# Altium footprint library BeaconBoard.PcbLib: 39 footprints (part 1 of 3) (continued)
## CP_32_7_ADI-M [mm] (continued)
  text "*" at -2.405,1.585 h0.64
Mechanical 15:
  region: -2.395,-3.058 -3.058,-3.058 -3.058,-2.395 -3.458,-2.395 -3.458,2.395 -3.058,2.395 -3.058,3.058 -2.395,3.058 -2.395,3.458 2.395,3.458 2.395,3.058 3.058,3.058 3.058,2.395 3.458,2.395 3.458,-2.395 3.058,-2.395 3.058,-3.058 2.395,-3.058 2.395,-3.458 -2.395,-3.458
  lines w0.152: -3.458,-2.395 -3.458,2.395 -3.058,2.395 -3.058,3.058 -2.395,3.058 -2.395,3.458 2.395,3.458 2.395,3.058 3.058,3.058 3.058,2.395 3.458,2.395 3.458,-2.395 3.058,-2.395 3.058,-3.058 2.395,-3.058 2.395,-3.458 -2.395,-3.458 -2.395,-3.058 -3.058,-3.058 -3.058,-2.395 -3.458,-2.395
3D body: height 0.25, standoff 0, extent 0,0 0.254,0.254
3D body "CP_32_7_ADI.step": height 0.8, standoff 0, extent -2.55,-2.55 2.55,2.55

## DBV0005A-IPC_A [mm]
pads (5):
  rect 1.805x0.612 smd paste+0 mask+0: 1(-1.15,0.95) 2(-1.15,0) 3(-1.15,-0.95) 4(1.15,-0.95) 5(1.15,0.95)
Top Overlay:
  circle w0.25: c-2.903,0.975 r0.125
  lines w0.15: -1.4,-1.7 1.4,-1.7 ; -1.4,1.7 1.4,1.7
Mechanical 13:
  lines w0.15: -0.8,-1.45 -0.8,1.45 0.8,1.45 0.8,-1.45 -0.8,-1.45
3D body: height 0.25, standoff 0, extent 0,0 0.254,0.254
3D body "DBV0005A.stp": height 1.2, standoff 0, extent -1.4,-1.45 1.4,1.45

## DBV0005A-IPC_B [mm]
pads (5):
  rect 1.505x0.572 smd paste+0 mask+0: 1(-1.1,0.95) 2(-1.1,0) 3(-1.1,-0.95) 4(1.1,-0.95) 5(1.1,0.95)
Top Overlay:
  circle w0.25: c-2.528,0.975 r0.125
  lines w0.15: -1.4,-1.7 1.4,-1.7 ; -1.4,1.7 1.4,1.7
Mechanical 13:
  lines w0.15: -0.8,-1.45 -0.8,1.45 0.8,1.45 0.8,-1.45 -0.8,-1.45
3D body "DBV0005A.stp": height 1.2, standoff 0, extent -1.4,-1.45 1.4,1.45
3D body: height 0.25, standoff 0, extent 0,0 0.254,0.254

## DBV0005A-IPC_C [mm]
pads (5):
  rect 1.205x0.532 smd paste+0 mask+0: 1(-1.05,0.95) 2(-1.05,0) 3(-1.05,-0.95) 4(1.05,-0.95) 5(1.05,0.95)
Top Overlay:
  circle w0.25: c-2.328,0.975 r0.125
  lines w0.15: -0.052,-1.45 0.052,-1.45 0.052,1.45 -0.052,1.45 -0.052,-1.45
Mechanical 13:
  lines w0.15: -0.8,-1.45 -0.8,1.45 0.8,1.45 0.8,-1.45 -0.8,-1.45
3D body: height 0.25, standoff 0, extent 0,0 0.254,0.254
3D body "DBV0005A.stp": height 1.2, standoff 0, extent -1.4,-1.45 1.4,1.45

## DBV0005A-MFG [mm]
pads (5):
  rect 1.1x0.6 smd paste+0 mask+0: 1(-1.3,0.95) 2(-1.3,0) 3(-1.3,-0.95) 4(1.3,-0.95) 5(1.3,0.95)
Top Overlay:
  circle w0.25: c-2.45,0.95 r0.125
  lines w0.15: -0.375,-1.525 0.375,-1.525 ; -0.375,1.525 0.375,1.525 ; 0.875,-0.275 0.875,0.275
Mechanical 13:
  lines w0.15: -0.875,-1.525 -0.875,1.525 0.875,1.525 0.875,-1.525 -0.875,-1.525
3D body: height 0.25, standoff 0, extent 0,0 0.254,0.254
3D body "DBV0005A.stp": height 1.2, standoff 0, extent -1.4,-1.45 1.4,1.45

## DPAK254P1510X470-3N [mm] "D2-PAK, 3-Pads, Body 7.73x8.49mm (max), IPC Medium Density"
height 4.7
pads (3):
  rect 3.7x1 smd: 1(-6.65,2.54) 3(-6.65,-2.54)
  rect 8.6x10.35 smd: 2(4.25,0)
Top Overlay:
  circle w0.25: c-6.65,3.59 r0.125
  lines w0.2: -0.45,-5.15 -2.45,-5.15 -2.45,5.15 -0.45,5.15
Mechanical 13:
  lines w0.1: -2.45,-5.125 6.8,-5.125 6.8,5.125 -2.45,5.125 -2.45,-5.125
Mechanical 15:
  lines w0.05: -8.75,-5.425 8.75,-5.425 8.75,5.425 -8.75,5.425 -8.75,-5.425
  lines w0.1: -0.5,0 0.5,0 ; 0,-0.5 0,0.5
3D body "DPAK254P1510X470-3N.step": height 4.7, standoff 0, extent -6.715,-5.125 8.385,5.125

## EM33X [mm] "Butterfly for GH High Power DFB Laser"
pads (14):
  round 1.7 hole 1.2: 1(7.62,9) 2(5.08,9) 3(2.54,9) 4(0,9) 5(-2.54,9) 6(-5.08,9) 7(-7.62,9) 8(-7.62,-9) 9(-5.08,-9) 10(-2.54,-9) 11(0,-9) 12(2.54,-9) 13(5.08,-9) 14(7.62,-9)
Keep-Out Layer:
  board cut-out: -16,6.5 -16,6.598 -15.962,6.792 -15.886,6.974 -15.777,7.137 -15.637,7.277 -15.474,7.386 -15.292,7.462 -15.098,7.5 -15,7.5 15,7.5 15.098,7.5 15.292,7.462 15.474,7.386 15.637,7.277 15.777,7.137 15.886,6.974 15.962,6.792 16,6.598 16,6.5 16,-6.5 16,-6.598 15.962,-6.792 15.886,-6.974 15.777,-7.137 15.637,-7.277 15.474,-7.386 15.292,-7.462 15.098,-7.5 15,-7.5 -15,-7.5 -15.098,-7.5 -15.292,-7.462 -15.474,-7.386 -15.637,-7.277 -15.777,-7.137 -15.886,-6.974 -15.962,-6.792 -16,-6.598 -16,-6.5
Mechanical 5:
  circle w0.254: c13.02,-4.445 r1.35
  circle w0.254: c-13.02,-4.445 r1.35
  circle w0.254: c-13.02,4.445 r1.35
  circle w0.254: c13.02,4.445 r1.35
  lines w0.254: -10.415,-6.35 -10.415,6.35 ; -9.15,-6.35 -9.15,-6.85 9.15,-6.85 9.15,-6.35 ; -9.15,6.35 -9.15,6.85 9.15,6.85 9.15,6.35 ; 10.415,-6.35 10.415,6.35 ; -14.99,-6.35 -14.99,6.35 14.99,6.35 14.99,-6.35 -14.99,-6.35
Multi-Layer:
  pour cut-out: -16.5,6.5 -16.5,6.648 -16.442,6.938 -16.329,7.211 -16.165,7.456 -15.956,7.665 -15.711,7.829 -15.438,7.942 -15.148,8 -15,8 15,8 15.148,8 15.438,7.942 15.711,7.829 15.956,7.665 16.165,7.456 16.329,7.211 16.442,6.938 16.5,6.648 16.5,6.5 16.5,-6.5 16.5,-6.648 16.442,-6.938 16.329,-7.211 16.165,-7.456 15.956,-7.665 15.711,-7.829 15.438,-7.942 15.148,-8 15,-8 -15,-8 -15.148,-8 -15.438,-7.942 -15.711,-7.829 -15.956,-7.665 -16.165,-7.456 -16.329,-7.211 -16.442,-6.938 -16.5,-6.648 -16.5,-6.5
3D body: height 5.15, standoff 3.55, extent -0.8,6.85 0.794,6.95
3D body: height 5.75, standoff 2.95, extent -9.15,-6.85 9.15,-6.35
3D body: height 5.75, standoff 2.95, extent -9.15,6.35 9.15,6.85
3D body: height 7.15, standoff 0.35, extent -10.415,-6.35 10.415,6.35
3D body: height 0.35, standoff -0.65, extent -14.99,-6.35 14.99,6.35
3D body: height 5.15, standoff 3.55, extent 1.74,6.85 3.334,6.95
3D body: height 5.15, standoff 3.55, extent 4.28,6.85 5.874,6.95
3D body: height 5.15, standoff 3.55, extent 6.82,6.85 8.414,6.95
3D body: height 5.15, standoff 3.55, extent -8.413,6.85 -6.82,6.95
3D body: height 5.15, standoff 3.55, extent -5.873,6.85 -4.28,6.95
3D body: height 5.15, standoff 3.55, extent -3.333,6.85 -1.74,6.95
3D body: height 5.15, standoff 3.55, extent 1.739,-6.95 3.333,-6.85
3D body: height 5.15, standoff 3.55, extent 4.279,-6.95 5.873,-6.85
3D body: height 5.15, standoff 3.55, extent 6.819,-6.95 8.413,-6.85
3D body: height 5.15, standoff 3.55, extent -8.414,-6.95 -6.82,-6.85
3D body: height 5.15, standoff 3.55, extent -5.874,-6.95 -4.28,-6.85
3D body: height 5.15, standoff 3.55, extent -3.334,-6.95 -1.74,-6.85
3D body: height 5.15, standoff 3.55, extent -0.794,-6.95 0.8,-6.85
3D body: height 6.45, standoff 2.05, extent 10.415,-2.197 30.415,2.197
3D body: height 4.7, standoff 3.8, extent 28.909,-0.449 31.909,0.449

## GH High Power DFB Laser AA1401 [mm] "Laser Pulser"
pads (14):
  rect 0.7x2.5 smd: 1(7.62,9.675) 2(5.08,9.675) 3(2.54,9.675) 4(0,9.675) 5(-2.54,9.675) 6(-5.08,9.675) 7(-7.62,9.675) 8(-7.62,-9.675) 9(-5.08,-9.675) 10(-2.54,-9.675) 11(0,-9.675) 13(5.08,-9.675) 14(7.62,-9.675)
  rect 0.5x2.5 smd: 12(2.54,-9.675)
Top Overlay:
  lines w0.254: -10.75,-7.5 -10.25,-8 10.25,-8 10.75,-7.5 10.75,-5 10.75,-3 11.125,-2.625 11.25,-2.5 36.75,-2.5 37.25,-2 37.25,1.875 37.25,2 36.75,2.5 11.25,2.5 10.75,3 10.75,7.5 10.25,8 -10.25,8 -10.75,7.5 -10.75,-7.5
Keep-Out Layer:
  board cut-out: 10.25,7.875 10.625,7.5 10.625,3 11.25,2.375 36.75,2.375 37.125,2 37.125,-2 36.75,-2.375 11.25,-2.375 10.625,-3 10.625,-7.5 10.25,-7.875 -10.25,-7.875 -10.625,-7.5 -10.625,7.5 -10.25,7.875
Multi-Layer:
  pour cut-out: -10.375,8.125 -10.75,7.75 -10.875,7.625 -10.875,-7.625 -10.375,-8.125 10.375,-8.125 10.875,-7.625 10.875,-3.125 11.375,-2.625 23.125,-2.625 36.875,-2.625 37.375,-2.125 37.375,2.125 36.875,2.625 11.375,2.625 10.875,3.125 10.875,7.625 10.375,8.125
3D body "AA1401_series_laser_trimmed.STEP": height 4.04, standoff -5.45, extent -14.975,-11.525 37.225,11.575

## IC24_TPS259802ONRGER_TEX [mil]
pads (26):
  rect 31x8 smd paste+0 mask+0: 1(-77,49.21) 2(-77,29.53) 3(-77,9.84) 4(-77,-9.84) 5(-77,-29.53) 6(-77,-49.21) 13(77,-49.21) 14(77,-29.53) 15(77,-9.84) 16(77,9.84) 17(77,29.53) 18(77,49.21)
  rect 8x31 smd paste+0 mask+0: 7(-49.21,-77) 8(-29.53,-77) 9(-9.84,-77) 10(9.84,-77) 11(29.53,-77) 12(49.21,-77) 19(49.21,77) 20(29.53,77) 21(9.84,77) 22(-9.84,77) 23(-29.53,77) 24(-49.21,77)
  rect 106x61 smd paste+0 mask+0: 25(0,24.61)
  rect 106x37 smd paste+0 mask+0: 26(0,-37.4)
Top Overlay:
  region: 37.03,102.5 22.03,102.5 22.03,112.5 37.03,112.5
  region: 17.34,-102.5 2.34,-102.5 2.34,-112.5 17.34,-112.5
  lines w6: -85.5,-66.31 -85.5,-85.5 -66.31,-85.5 ; -85.5,66.31 -85.5,85.5 -66.31,85.5 ; 66.31,-85.5 85.5,-85.5 85.5,-66.31 ; 66.31,85.5 85.5,85.5 85.5,66.31
  text "*" at -130,24.21 h50
Mechanical 5:
  region: 117.5,-117.5 -117.5,-117.5 -117.5,117.5 117.5,117.5
Mechanical 7:
  lines w1: -276.5,-80.5 80.5,-80.5 ; -276.5,80.5 80.5,80.5 80.5,-226.5 ; -195.5,-5.89 -53,-5.89 -53,-145.5 ; -195.5,55.11 -53,55.11 ; -180.5,-55.89 -180.5,-5.89 ; -180.5,105.11 -180.5,55.11 ; -103,-130.5 -53,-130.5 ; -103,130.5 -53,130.5 ; -80.5,-226.5 -80.5,80.5 ; -80.5,49.21 -80.5,276.5 ; -53,55.9 -53,145.5 ; 11.5,186.5 61.5,186.5 ; 49.21,80.5 276.5,80.5 ; 53,-145.5 53,-5.89 ; 53,55.11 53,145.5 ; 61.5,49.21 61.5,201.5 ; 77,29.53 201.5,29.53 ; 77,49.21 201.5,49.21 ; 80.5,-49.21 195.5,-49.21 ; 80.5,201.5 80.5,49.21 80.5,276.5 ; 103,-130.5 53,-130.5 ; 103,130.5 53,130.5 ; 130.5,186.5 80.5,186.5 ; 180.5,-130.5 180.5,-80.5 ; 180.5,0.79 180.5,-49.21 ; 186.5,-20.47 186.5,29.53 ; 186.5,99.21 186.5,49.21 ; 195.5,-80.5 49.21,-80.5 276.5,-80.5 ; -261.5,-80.5 -256.5,-70.5 -266.5,-70.5 -261.5,-80.5 ; -261.5,-80.5 -261.5,80.5 ; -261.5,80.5 -256.5,70.5 -266.5,70.5 -261.5,80.5 ; -180.5,-5.89 -175.5,-15.89 -185.5,-15.89 -180.5,-5.89 ; -180.5,55.11 -175.5,65.11 -185.5,65.11 -180.5,55.11 ; -80.5,-211.5 -70.5,-216.5 -70.5,-206.5 -80.5,-211.5 ; -80.5,-211.5 80.5,-211.5 ; -80.5,261.5 -70.5,256.5 -70.5,266.5 -80.5,261.5 ; -80.5,261.5 80.5,261.5 ; -53,-130.5 -63,-135.5 -63,-125.5 -53,-130.5 ; -53,130.5 -63,125.5 -63,135.5 -53,130.5 ; 53,-130.5 63,-135.5 63,-125.5 53,-130.5 ; 53,130.5 63,125.5 63,135.5 53,130.5 ; 61.5,186.5 51.5,181.5 51.5,191.5 61.5,186.5 ; 80.5,-211.5 70.5,-216.5 70.5,-206.5 80.5,-211.5 ; 80.5,186.5 90.5,181.5 90.5,191.5 80.5,186.5 ; 80.5,261.5 70.5,256.5 70.5,266.5 80.5,261.5 ; 180.5,-80.5 185.5,-90.5 175.5,-90.5 180.5,-80.5 ; 180.5,-49.21 185.5,-39.21 175.5,-39.21 180.5,-49.21 ; 186.5,29.53 191.5,19.53 181.5,19.53 186.5,29.53 ; 186.5,49.21 191.5,59.21 181.5,59.21 186.5,49.21 ; 261.5,-80.5 266.5,-70.5 256.5,-70.5 261.5,-80.5 ; 261.5,-80.5 261.5,80.5 ; 261.5,80.5 266.5,70.5 256.5,70.5 261.5,80.5
  text "0.031in/0.795mm" at 86.75,-75 h25
  text "-0.106in/-2.692mm" at -106.25,150.5 h25
  text "0.061in/1.549mm" at -274.25,-20 h25
  text "0.106in/2.692mm" at -93.75,-175.5 h25
  text "0.161in/4.089mm" at -93.75,-256.5 h25
  text "0.161in/4.089mm" at -469,-12.5 h25
  text "0.161in/4.089mm" at 281.5,-12.5 h25
  text "0.161in/4.089mm" at -93.75,281.5 h25
  text "0.019in/0.483mm" at -22.75,206.5 h25
  text "0.02in/0.5mm" at 111.5,26.87 h25
  text "Alt 2 Padstyle: OX90Y60D30P" at -337.5,-816.5 h50
  text "Alt 1 Padstyle: OX60Y90D30P" at -337.5,-756.5 h50
  text "Heat Tab 2 Padstyle: RX106Y37D0T" at -400,-456.5 h50
  text "Heat Tab 1 Padstyle: RX106Y61D0T" at -400,-396.5 h50
  text "Default Padstyle: RX8Y31D0T" at -337.5,-336.5 h50
Mechanical 13:
  lines w1: -80.5,30.5 -30.5,80.5 ; -80.5,-80.5 -80.5,80.5 80.5,80.5 80.5,-80.5 -80.5,-80.5 ; -80.5,-54.21 -80.5,-44.21 -80.5,-54.21 ; -80.5,-34.53 -80.5,-24.53 -80.5,-34.53 ; -80.5,-14.84 -80.5,-4.84 -80.5,-14.84 ; -80.5,4.84 -80.5,14.84 -80.5,4.84 ; -80.5,24.53 -80.5,34.53 -80.5,24.53 ; -80.5,44.21 -80.5,54.21 -80.5,44.21 ; -54.21,-80.5 -44.21,-80.5 -54.21,-80.5 ; -54.21,80.5 -44.21,80.5 -54.21,80.5 ; -34.53,-80.5 -24.53,-80.5 -34.53,-80.5 ; -34.53,80.5 -24.53,80.5 -34.53,80.5 ; -14.84,-80.5 -4.84,-80.5 -14.84,-80.5 ; -14.84,80.5 -4.84,80.5 -14.84,80.5 ; 4.84,-80.5 14.84,-80.5 4.84,-80.5 ; 4.84,80.5 14.84,80.5 4.84,80.5 ; 24.53,-80.5 34.53,-80.5 24.53,-80.5 ; 24.53,80.5 34.53,80.5 24.53,80.5 ; 44.21,-80.5 54.21,-80.5 44.21,-80.5 ; 44.21,80.5 54.21,80.5 44.21,80.5 ; 80.5,-54.21 80.5,-44.21 80.5,-54.21 ; 80.5,-34.53 80.5,-24.53 80.5,-34.53 ; 80.5,-14.84 80.5,-4.84 80.5,-14.84 ; 80.5,4.84 80.5,14.84 80.5,4.84 ; 80.5,24.53 80.5,34.53 80.5,24.53 ; 80.5,44.21 80.5,54.21 80.5,44.21
  text "*" at -49,24.21 h50
Mechanical 15:
  region: -63.21,-90.5 -90.5,-90.5 -90.5,-63.21 -102.5,-63.21 -102.5,63.21 -90.5,63.21 -90.5,90.5 -63.21,90.5 -63.21,102.5 63.21,102.5 63.21,90.5 90.5,90.5 90.5,63.21 102.5,63.21 102.5,-63.21 90.5,-63.21 90.5,-90.5 63.21,-90.5 63.21,-102.5 -63.21,-102.5
  lines w6: -102.5,-63.21 -102.5,63.21 -90.5,63.21 -90.5,90.5 -63.21,90.5 -63.21,102.5 63.21,102.5 63.21,90.5 90.5,90.5 90.5,63.21 102.5,63.21 102.5,-63.21 90.5,-63.21 90.5,-90.5 63.21,-90.5 63.21,-102.5 -63.21,-102.5 -63.21,-90.5 -90.5,-90.5 -90.5,-63.21 -102.5,-63.21
3D body: height 10, standoff 0, extent 0,0 10,10

## IC24_TPS259802ONRGER_TEX-L [mil]
pads (26):
  rect 27x8 smd paste+0 mask+0: 1(-75,49.21) 2(-75,29.53) 3(-75,9.84) 4(-75,-9.84) 5(-75,-29.53) 6(-75,-49.21) 13(75,-49.21) 14(75,-29.53) 15(75,-9.84) 16(75,9.84) 17(75,29.53) 18(75,49.21)
  rect 8x27 smd paste+0 mask+0: 7(-49.21,-75) 8(-29.53,-75) 9(-9.84,-75) 10(9.84,-75) 11(29.53,-75) 12(49.21,-75) 19(49.21,75) 20(29.53,75) 21(9.84,75) 22(-9.84,75) 23(-29.53,75) 24(-49.21,75)
  rect 106x61 smd paste+0 mask+0: 25(0,24.61)
  rect 106x37 smd paste+0 mask+0: 26(0,-37.4)
Top Overlay:
  region: 37.03,98.5 22.03,98.5 22.03,108.5 37.03,108.5
  region: 17.34,-98.5 2.34,-98.5 2.34,-108.5 17.34,-108.5
  lines w6: -85.5,-66.31 -85.5,-85.5 -66.31,-85.5 ; -85.5,66.31 -85.5,85.5 -66.31,85.5 ; 66.31,-85.5 85.5,-85.5 85.5,-66.31 ; 66.31,85.5 85.5,85.5 85.5,66.31
  text "*" at -132,24.21 h50
Mechanical 5:
  region: 107.5,-107.5 -107.5,-107.5 -107.5,107.5 107.5,107.5
Mechanical 7:
  lines w1: -274.5,-80.5 80.5,-80.5 ; -274.5,80.5 80.5,80.5 80.5,-224.5 ; -195.5,-5.89 -53,-5.89 -53,-145.5 ; -195.5,55.11 -53,55.11 ; -180.5,-55.89 -180.5,-5.89 ; -180.5,105.11 -180.5,55.11 ; -103,-130.5 -53,-130.5 ; -103,130.5 -53,130.5 ; -80.5,-224.5 -80.5,80.5 ; -80.5,49.21 -80.5,274.5 ; -53,55.9 -53,145.5 ; 11.5,184.5 61.5,184.5 ; 49.21,80.5 274.5,80.5 ; 53,-145.5 53,-5.89 ; 53,55.11 53,145.5 ; 61.5,49.21 61.5,199.5 ; 75,29.53 199.5,29.53 ; 75,49.21 199.5,49.21 ; 80.5,-49.21 195.5,-49.21 ; 80.5,199.5 80.5,49.21 80.5,274.5 ; 103,-130.5 53,-130.5 ; 103,130.5 53,130.5 ; 130.5,184.5 80.5,184.5 ; 180.5,-130.5 180.5,-80.5 ; 180.5,0.79 180.5,-49.21 ; 184.5,-20.47 184.5,29.53 ; 184.5,99.21 184.5,49.21 ; 195.5,-80.5 49.21,-80.5 274.5,-80.5 ; -259.5,-80.5 -254.5,-70.5 -264.5,-70.5 -259.5,-80.5 ; -259.5,-80.5 -259.5,80.5 ; -259.5,80.5 -254.5,70.5 -264.5,70.5 -259.5,80.5 ; -180.5,-5.89 -175.5,-15.89 -185.5,-15.89 -180.5,-5.89 ; -180.5,55.11 -175.5,65.11 -185.5,65.11 -180.5,55.11 ; -80.5,-209.5 -70.5,-214.5 -70.5,-204.5 -80.5,-209.5 ; -80.5,-209.5 80.5,-209.5 ; -80.5,259.5 -70.5,254.5 -70.5,264.5 -80.5,259.5 ; -80.5,259.5 80.5,259.5 ; -53,-130.5 -63,-135.5 -63,-125.5 -53,-130.5 ; -53,130.5 -63,125.5 -63,135.5 -53,130.5 ; 53,-130.5 63,-135.5 63,-125.5 53,-130.5 ; 53,130.5 63,125.5 63,135.5 53,130.5 ; 61.5,184.5 51.5,179.5 51.5,189.5 61.5,184.5 ; 80.5,-209.5 70.5,-214.5 70.5,-204.5 80.5,-209.5 ; 80.5,184.5 90.5,179.5 90.5,189.5 80.5,184.5 ; 80.5,259.5 70.5,254.5 70.5,264.5 80.5,259.5 ; 180.5,-80.5 185.5,-90.5 175.5,-90.5 180.5,-80.5 ; 180.5,-49.21 185.5,-39.21 175.5,-39.21 180.5,-49.21 ; 184.5,29.53 189.5,19.53 179.5,19.53 184.5,29.53 ; 184.5,49.21 189.5,59.21 179.5,59.21 184.5,49.21 ; 259.5,-80.5 264.5,-70.5 254.5,-70.5 259.5,-80.5 ; 259.5,-80.5 259.5,80.5 ; 259.5,80.5 264.5,70.5 254.5,70.5 259.5,80.5
  text "0.031in/0.795mm" at 86.75,-73 h25
  text "-0.106in/-2.692mm" at -106.25,150.5 h25
  text "0.061in/1.549mm" at -274.25,-20 h25
  text "0.106in/2.692mm" at -93.75,-175.5 h25
  text "0.161in/4.089mm" at -93.75,-254.5 h25
  text "0.161in/4.089mm" at -467,-12.5 h25
  text "0.161in/4.089mm" at 279.5,-12.5 h25
  text "0.161in/4.089mm" at -93.75,279.5 h25
  text "0.019in/0.483mm" at -22.75,204.5 h25
  text "0.02in/0.5mm" at 109.5,26.87 h25
  text "Alt 2 Padstyle: OX90Y60D30P" at -337.5,-814.5 h50
  text "Alt 1 Padstyle: OX60Y90D30P" at -337.5,-754.5 h50
  text "Heat Tab 2 Padstyle: RX106Y37D0T" at -400,-454.5 h50
  text "Heat Tab 1 Padstyle: RX106Y61D0T" at -400,-394.5 h50
  text "Default Padstyle: RX8Y27D0T" at -337.5,-334.5 h50
Mechanical 13:
  lines w1: -80.5,30.5 -30.5,80.5 ; -80.5,-80.5 -80.5,80.5 80.5,80.5 80.5,-80.5 -80.5,-80.5 ; -80.5,-54.21 -80.5,-44.21 -80.5,-54.21 ; -80.5,-34.53 -80.5,-24.53 -80.5,-34.53 ; -80.5,-14.84 -80.5,-4.84 -80.5,-14.84 ; -80.5,4.84 -80.5,14.84 -80.5,4.84 ; -80.5,24.53 -80.5,34.53 -80.5,24.53 ; -80.5,44.21 -80.5,54.21 -80.5,44.21 ; -54.21,-80.5 -44.21,-80.5 -54.21,-80.5 ; -54.21,80.5 -44.21,80.5 -54.21,80.5 ; -34.53,-80.5 -24.53,-80.5 -34.53,-80.5 ; -34.53,80.5 -24.53,80.5 -34.53,80.5 ; -14.84,-80.5 -4.84,-80.5 -14.84,-80.5 ; -14.84,80.5 -4.84,80.5 -14.84,80.5 ; 4.84,-80.5 14.84,-80.5 4.84,-80.5 ; 4.84,80.5 14.84,80.5 4.84,80.5 ; 24.53,-80.5 34.53,-80.5 24.53,-80.5 ; 24.53,80.5 34.53,80.5 24.53,80.5 ; 44.21,-80.5 54.21,-80.5 44.21,-80.5 ; 44.21,80.5 54.21,80.5 44.21,80.5 ; 80.5,-54.21 80.5,-44.21 80.5,-54.21 ; 80.5,-34.53 80.5,-24.53 80.5,-34.53 ; 80.5,-14.84 80.5,-4.84 80.5,-14.84 ; 80.5,4.84 80.5,14.84 80.5,4.84 ; 80.5,24.53 80.5,34.53 80.5,24.53 ; 80.5,44.21 80.5,54.21 80.5,44.21
  text "*" at -43,24.21 h50
Mechanical 15:
  region: -57.21,-84.5 -84.5,-84.5 -84.5,-57.21 -92.5,-57.21 -92.5,57.21 -84.5,57.21 -84.5,84.5 -57.21,84.5 -57.21,92.5 57.21,92.5 57.21,84.5 84.5,84.5 84.5,57.21 92.5,57.21 92.5,-57.21 84.5,-57.21 84.5,-84.5 57.21,-84.5 57.21,-92.5 -57.21,-92.5
  lines w6: -92.5,-57.21 -92.5,57.21 -84.5,57.21 -84.5,84.5 -57.21,84.5 -57.21,92.5 57.21,92.5 57.21,84.5 84.5,84.5 84.5,57.21 92.5,57.21 92.5,-57.21 84.5,-57.21 84.5,-84.5 57.21,-84.5 57.21,-92.5 -57.21,-92.5 -57.21,-84.5 -84.5,-84.5 -84.5,-57.21 -92.5,-57.21
3D body "IC24_TPS259802ONRGER_TEX.step": height 39.09, standoff 0, extent -80.51,-80.51 80.52,80.52
3D body: height 10, standoff 0, extent 0,0 10,10

## IC24_TPS259802ONRGER_TEX-M [mil]
pads (26):
  rect 35x8 smd paste+0 mask+0: 1(-79,49.21) 2(-79,29.53) 3(-79,9.84) 4(-79,-9.84) 5(-79,-29.53) 6(-79,-49.21) 13(79,-49.21) 14(79,-29.53) 15(79,-9.84) 16(79,9.84) 17(79,29.53) 18(79,49.21)
  rect 8x35 smd paste+0 mask+0: 7(-49.21,-79) 8(-29.53,-79) 9(-9.84,-79) 10(9.84,-79) 11(29.53,-79) 12(49.21,-79) 19(49.21,79) 20(29.53,79) 21(9.84,79) 22(-9.84,79) 23(-29.53,79) 24(-49.21,79)
  rect 106x61 smd paste+0 mask+0: 25(0,24.61)
  rect 106x37 smd paste+0 mask+0: 26(0,-37.4)
Top Overlay:
  region: 17.34,-106.5 2.34,-106.5 2.34,-116.5 17.34,-116.5
  region: 37.03,106.5 22.03,106.5 22.03,116.5 37.03,116.5
  lines w6: -85.5,-66.31 -85.5,-85.5 -66.31,-85.5 ; -85.5,66.31 -85.5,85.5 -66.31,85.5 ; 66.31,-85.5 85.5,-85.5 85.5,-66.31 ; 66.31,85.5 85.5,85.5 85.5,66.31
  text "*" at -140,24.21 h50
Mechanical 5:
  region: 131.5,-131.5 -131.5,-131.5 -131.5,131.5 131.5,131.5
Mechanical 7:
  lines w1: -278.5,-80.5 80.5,-80.5 ; -278.5,80.5 80.5,80.5 80.5,-228.5 ; -195.5,-5.89 -53,-5.89 -53,-145.5 ; -195.5,55.11 -53,55.11 ; -180.5,-55.89 -180.5,-5.89 ; -180.5,105.11 -180.5,55.11 ; -103,-130.5 -53,-130.5 ; -103,130.5 -53,130.5 ; -80.5,-228.5 -80.5,80.5 ; -80.5,49.21 -80.5,278.5 ; -53,55.9 -53,145.5 ; 11.5,188.5 61.5,188.5 ; 49.21,80.5 278.5,80.5 ; 53,-145.5 53,-5.89 ; 53,55.11 53,145.5 ; 61.5,49.21 61.5,203.5 ; 79,29.53 203.5,29.53 ; 79,49.21 203.5,49.21 ; 80.5,-49.21 195.5,-49.21 ; 80.5,203.5 80.5,49.21 80.5,278.5 ; 103,-130.5 53,-130.5 ; 103,130.5 53,130.5 ; 130.5,188.5 80.5,188.5 ; 180.5,-130.5 180.5,-80.5 ; 180.5,0.79 180.5,-49.21 ; 188.5,-20.47 188.5,29.53 ; 188.5,99.21 188.5,49.21 ; 195.5,-80.5 49.21,-80.5 278.5,-80.5 ; -263.5,-80.5 -263.5,80.5 ; -263.5,-80.5 -268.5,-70.5 -258.5,-70.5 -263.5,-80.5 ; -263.5,80.5 -268.5,70.5 -258.5,70.5 -263.5,80.5 ; -180.5,-5.89 -185.5,-15.89 -175.5,-15.89 -180.5,-5.89 ; -180.5,55.11 -185.5,65.11 -175.5,65.11 -180.5,55.11 ; -80.5,-213.5 80.5,-213.5 ; -80.5,-213.5 -70.5,-208.5 -70.5,-218.5 -80.5,-213.5 ; -80.5,263.5 80.5,263.5 ; -80.5,263.5 -70.5,268.5 -70.5,258.5 -80.5,263.5 ; -53,-130.5 -63,-125.5 -63,-135.5 -53,-130.5 ; -53,130.5 -63,135.5 -63,125.5 -53,130.5 ; 53,-130.5 63,-125.5 63,-135.5 53,-130.5 ; 53,130.5 63,135.5 63,125.5 53,130.5 ; 61.5,188.5 51.5,193.5 51.5,183.5 61.5,188.5 ; 80.5,-213.5 70.5,-208.5 70.5,-218.5 80.5,-213.5 ; 80.5,188.5 90.5,193.5 90.5,183.5 80.5,188.5 ; 80.5,263.5 70.5,268.5 70.5,258.5 80.5,263.5 ; 180.5,-80.5 175.5,-90.5 185.5,-90.5 180.5,-80.5 ; 180.5,-49.21 175.5,-39.21 185.5,-39.21 180.5,-49.21 ; 188.5,29.53 183.5,19.53 193.5,19.53 188.5,29.53 ; 188.5,49.21 183.5,59.21 193.5,59.21 188.5,49.21 ; 263.5,-80.5 263.5,80.5 ; 263.5,-80.5 258.5,-70.5 268.5,-70.5 263.5,-80.5 ; 263.5,80.5 258.5,70.5 268.5,70.5 263.5,80.5
  text "Default Padstyle: RX8Y35D0T" at -337.5,-338.5 h50
  text "Heat Tab 1 Padstyle: RX106Y61D0T" at -400,-398.5 h50
  text "Heat Tab 2 Padstyle: RX106Y37D0T" at -400,-458.5 h50
  text "Alt 1 Padstyle: OX60Y90D30P" at -337.5,-758.5 h50
  text "Alt 2 Padstyle: OX90Y60D30P" at -337.5,-818.5 h50
  text "0.02in/0.5mm" at 113.5,26.87 h25
  text "0.019in/0.483mm" at -22.75,208.5 h25
  text "0.161in/4.089mm" at -93.75,283.5 h25
  text "0.161in/4.089mm" at 283.5,-12.5 h25
  text "0.161in/4.089mm" at -471,-12.5 h25
  text "0.161in/4.089mm" at -93.75,-258.5 h25
  text "0.106in/2.692mm" at -93.75,-175.5 h25
  text "0.061in/1.549mm" at -274.25,-20 h25
  text "-0.106in/-2.692mm" at -106.25,150.5 h25
  text "0.031in/0.795mm" at 86.75,-77 h25
Mechanical 13:
  lines w1: -80.5,30.5 -30.5,80.5 ; -80.5,-80.5 80.5,-80.5 80.5,80.5 -80.5,80.5 -80.5,-80.5 ; -80.5,-54.21 -80.5,-44.21 -80.5,-54.21 ; -80.5,-34.53 -80.5,-24.53 -80.5,-34.53 ; -80.5,-14.84 -80.5,-4.84 -80.5,-14.84 ; -80.5,4.84 -80.5,14.84 -80.5,4.84 ; -80.5,24.53 -80.5,34.53 -80.5,24.53 ; -80.5,44.21 -80.5,54.21 -80.5,44.21 ; -54.21,-80.5 -44.21,-80.5 -54.21,-80.5 ; -54.21,80.5 -44.21,80.5 -54.21,80.5 ; -34.53,-80.5 -24.53,-80.5 -34.53,-80.5 ; -34.53,80.5 -24.53,80.5 -34.53,80.5 ; -14.84,-80.5 -4.84,-80.5 -14.84,-80.5 ; -14.84,80.5 -4.84,80.5 -14.84,80.5 ; 4.84,-80.5 14.84,-80.5 4.84,-80.5 ; 4.84,80.5 14.84,80.5 4.84,80.5 ; 24.53,-80.5 34.53,-80.5 24.53,-80.5 ; 24.53,80.5 34.53,80.5 24.53,80.5 ; 44.21,-80.5 54.21,-80.5 44.21,-80.5 ; 44.21,80.5 54.21,80.5 44.21,80.5 ; 80.5,-54.21 80.5,-44.21 80.5,-54.21 ; 80.5,-34.53 80.5,-24.53 80.5,-34.53 ; 80.5,-14.84 80.5,-4.84 80.5,-14.84 ; 80.5,4.84 80.5,14.84 80.5,4.84 ; 80.5,24.53 80.5,34.53 80.5,24.53 ; 80.5,44.21 80.5,54.21 80.5,44.21
  text "*" at -43,24.21 h50
Mechanical 15:
  region: -73.21,-100.5 -100.5,-100.5 -100.5,-73.21 -116.5,-73.21 -116.5,73.21 -100.5,73.21 -100.5,100.5 -73.21,100.5 -73.21,116.5 73.21,116.5 73.21,100.5 100.5,100.5 100.5,73.21 116.5,73.21 116.5,-73.21 100.5,-73.21 100.5,-100.5 73.21,-100.5 73.21,-116.5 -73.21,-116.5
  lines w6: -116.5,-73.21 -100.5,-73.21 -100.5,-100.5 -73.21,-100.5 -73.21,-116.5 73.21,-116.5 73.21,-100.5 100.5,-100.5 100.5,-73.21 116.5,-73.21 116.5,73.21 100.5,73.21 100.5,100.5 73.21,100.5 73.21,116.5 -73.21,116.5 -73.21,100.5 -100.5,100.5 -100.5,73.21 -116.5,73.21 -116.5,-73.21
3D body "IC24_TPS259802ONRGER_TEX.step": height 39.09, standoff 0, extent -80.5,-80.5 80.52,80.52
3D body: height 10, standoff 0, extent 0,0 10,10
3D body "IC24_TPS259802ONRGER_TEX.step": height 39.09, standoff 0, extent -80.51,-80.51 80.52,80.52
3D body "IC24_TPS259802ONRGER_TEX.step": height 39.09, standoff 0, extent -80.51,-80.51 80.52,80.52